# Altium footprint library Connectors.PcbLib: 158 footprints (part 9 of 10)
Each footprint in its own frame and in the unit in brackets; x right, y up, seen from the top. Pads: shape width x height; smd on the part's side, far side on the other; paste and mask are expansions set on the pad; w line width, h text height; cw(c..) or ccw(c..) is an arc to the next point about the centre after c.
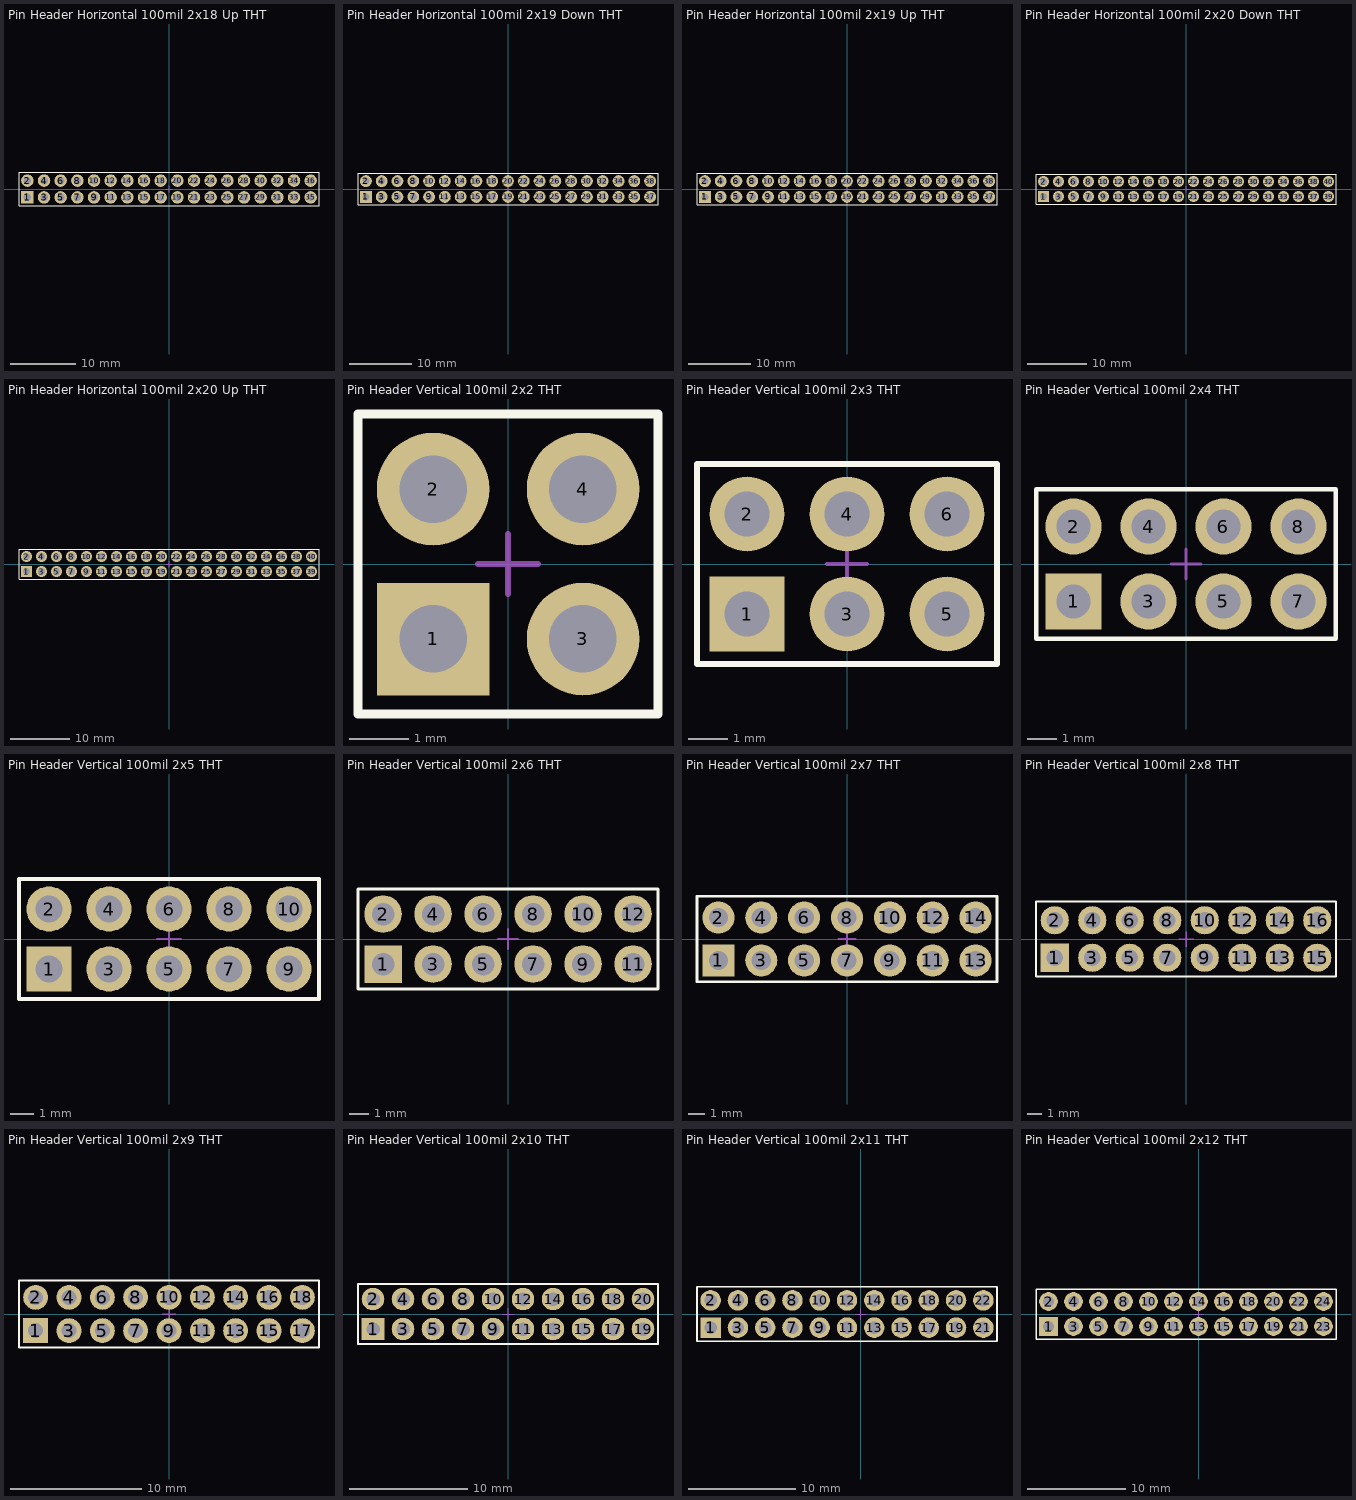
[diagram p8: the footprints below, top view; thin cyan lines are the x and y axes]

## Pin Header Horizontal 100mil 2x18 Up THT [mil]
pads (36):
  rect 75x75 hole 45: 1(-850,-50)
  round 75 hole 45: 2(-850,50) 3(-750,-50) 4(-750,50) 5(-650,-50) 6(-650,50) 7(-550,-50) 8(-550,50) 9(-450,-50) 10(-450,50) 11(-350,-50) 12(-350,50) 13(-250,-50) 14(-250,50) 15(-150,-50) 16(-150,50) 17(-50,-50) 18(-50,50) 19(50,-50) 20(50,50) 21(150,-50) 22(150,50) 23(250,-50) 24(250,50) 25(350,-50) 26(350,50) 27(450,-50) 28(450,50) 29(550,-50) 30(550,50) 31(650,-50) 32(650,50) 33(750,-50) 34(750,50) 35(850,-50) 36(850,50)
Top Overlay:
  lines w6: -900,-100 900,-100 900,100 -900,100 -900,-100
Mechanical 15:
  lines w4: -20,0 20,0 ; 0,-20 0,20
3D body "pin_header_horizontal_100mil_2x18_THT.stp": height 201, standoff -117.11, extent -899.99,-61.65 900.01,446.23

## Pin Header Horizontal 100mil 2x19 Down THT [mil]
pads (38):
  rect 75x75 hole 45: 1(-900,-50)
  round 75 hole 45: 2(-900,50) 3(-800,-50) 4(-800,50) 5(-700,-50) 6(-700,50) 7(-600,-50) 8(-600,50) 9(-500,-50) 10(-500,50) 11(-400,-50) 12(-400,50) 13(-300,-50) 14(-300,50) 15(-200,-50) 16(-200,50) 17(-100,-50) 18(-100,50) 19(0,-50) 20(0,50) 21(100,-50) 22(100,50) 23(200,-50) 24(200,50) 25(300,-50) 26(300,50) 27(400,-50) 28(400,50) 29(500,-50) 30(500,50) 31(600,-50) 32(600,50) 33(700,-50) 34(700,50) 35(800,-50) 36(800,50) 37(900,-50) 38(900,50)
Top Overlay:
  lines w6: -950,-100 -950,100 950,100 950,-100 -950,-100
Mechanical 15:
  lines w4: -20,0 20,0 ; 0,-20 0,20
3D body "pin_header_horizontal_100mil_2x2_THT.stp": height 201, standoff -117.11, extent 750,-443.94 950,63.94
3D body "pin_header_horizontal_100mil_2x17_THT.stp": height 201, standoff -117.11, extent -950,-446.22 750,61.65

## Pin Header Horizontal 100mil 2x19 Up THT [mil]
pads (38):
  rect 75x75 hole 45: 1(-900,-50)
  round 75 hole 45: 2(-900,50) 3(-800,-50) 4(-800,50) 5(-700,-50) 6(-700,50) 7(-600,-50) 8(-600,50) 9(-500,-50) 10(-500,50) 11(-400,-50) 12(-400,50) 13(-300,-50) 14(-300,50) 15(-200,-50) 16(-200,50) 17(-100,-50) 18(-100,50) 19(0,-50) 20(0,50) 21(100,-50) 22(100,50) 23(200,-50) 24(200,50) 25(300,-50) 26(300,50) 27(400,-50) 28(400,50) 29(500,-50) 30(500,50) 31(600,-50) 32(600,50) 33(700,-50) 34(700,50) 35(800,-50) 36(800,50) 37(900,-50) 38(900,50)
Top Overlay:
  lines w6: -950,-100 950,-100 950,100 -950,100 -950,-100
Mechanical 15:
  lines w4: -20,0 20,0 ; 0,-20 0,20
3D body "pin_header_horizontal_100mil_2x17_THT.stp": height 201, standoff -117.11, extent -950,-57.88 750,450
3D body "pin_header_horizontal_100mil_2x2_THT.stp": height 201, standoff -117.11, extent 750,-57.88 950,450

## Pin Header Horizontal 100mil 2x20 Down THT [mil]
pads (40):
  rect 75x75 hole 45: 1(-950,-50)
  round 75 hole 45: 2(-950,50) 3(-850,-50) 4(-850,50) 5(-750,-50) 6(-750,50) 7(-650,-50) 8(-650,50) 9(-550,-50) 10(-550,50) 11(-450,-50) 12(-450,50) 13(-350,-50) 14(-350,50) 15(-250,-50) 16(-250,50) 17(-150,-50) 18(-150,50) 19(-50,-50) 20(-50,50) 21(50,-50) 22(50,50) 23(150,-50) 24(150,50) 25(250,-50) 26(250,50) 27(350,-50) 28(350,50) 29(450,-50) 30(450,50) 31(550,-50) 32(550,50) 33(650,-50) 34(650,50) 35(750,-50) 36(750,50) 37(850,-50) 38(850,50) 39(950,-50) 40(950,50)
Top Overlay:
  lines w6: -1000,-100 -1000,100 1000,100 1000,-100 -1000,-100
Mechanical 15:
  lines w4: -20,0 20,0 ; 0,-20 0,20
3D body "pin_header_horizontal_100mil_2x20_THT.stp": height 201, standoff -117.11, extent -1000,-446.22 1000,61.65

## Pin Header Horizontal 100mil 2x20 Up THT [mil]
pads (40):
  rect 75x75 hole 45: 1(-950,-50)
  round 75 hole 45: 2(-950,50) 3(-850,-50) 4(-850,50) 5(-750,-50) 6(-750,50) 7(-650,-50) 8(-650,50) 9(-550,-50) 10(-550,50) 11(-450,-50) 12(-450,50) 13(-350,-50) 14(-350,50) 15(-250,-50) 16(-250,50) 17(-150,-50) 18(-150,50) 19(-50,-50) 20(-50,50) 21(50,-50) 22(50,50) 23(150,-50) 24(150,50) 25(250,-50) 26(250,50) 27(350,-50) 28(350,50) 29(450,-50) 30(450,50) 31(550,-50) 32(550,50) 33(650,-50) 34(650,50) 35(750,-50) 36(750,50) 37(850,-50) 38(850,50) 39(950,-50) 40(950,50)
Top Overlay:
  lines w6: -1000,-100 1000,-100 1000,100 -1000,100 -1000,-100
Mechanical 15:
  lines w4: -20,0 20,0 ; 0,-20 0,20
3D body "pin_header_horizontal_100mil_2x20_THT.stp": height 201, standoff -117.11, extent -999.99,-61.65 1000.01,446.23

## Pin Header Vertical 100mil 2x2 THT [mil]
pads (4):
  rect 75x75 hole 45: 1(-50,-50)
  round 75 hole 45: 2(-50,50) 3(50,-50) 4(50,50)
Top Overlay:
  lines w6: -100,-100 -100,100 100,100 100,-100 -100,-100
Mechanical 15:
  lines w4: -20,0 20,0 ; 0,-20 0,20
3D body "pin_header_vertical_100mil_2x2_THT.stp": height 337.22, standoff -117.11, extent -99.99,-99.99 100.01,100.01

## Pin Header Vertical 100mil 2x3 THT [mil]
pads (6):
  rect 75x75 hole 45: 1(-100,-50)
  round 75 hole 45: 2(-100,50) 3(0,-50) 4(0,50) 5(100,-50) 6(100,50)
Top Overlay:
  lines w6: -150,-100 150,-100 150,100 -150,100 -150,-100
Mechanical 15:
  lines w4: -20,0 20,0 ; 0,-20 0,20
3D body "pin_header_vertical_100mil_2x3_THT.stp": height 337.22, standoff -117.11, extent -149.99,-99.99 150.01,100.01

## Pin Header Vertical 100mil 2x4 THT [mil]
pads (8):
  rect 75x75 hole 45: 1(-150,-50)
  round 75 hole 45: 2(-150,50) 3(-50,-50) 4(-50,50) 5(50,-50) 6(50,50) 7(150,-50) 8(150,50)
Top Overlay:
  lines w6: -200,-100 200,-100 200,100 -200,100 -200,-100
Mechanical 15:
  lines w4: -20,0 20,0 ; 0,-20 0,20
3D body "pin_header_vertical_100mil_2x4_THT.stp": height 337.22, standoff -117.11, extent -199.99,-99.99 200.01,100.01

## Pin Header Vertical 100mil 2x5 THT [mil]
pads (10):
  rect 75x75 hole 45: 1(-200,-50)
  round 75 hole 45: 2(-200,50) 3(-100,-50) 4(-100,50) 5(0,-50) 6(0,50) 7(100,-50) 8(100,50) 9(200,-50) 10(200,50)
Top Overlay:
  lines w6: -250,-100 -250,100 250,100 250,-100 -250,-100
Mechanical 15:
  lines w4: -20,0 20,0 ; 0,-20 0,20
3D body "pin_header_vertical_100mil_2x5_THT.stp": height 337.22, standoff -117.11, extent -249.99,-99.99 250.01,100.01

## Pin Header Vertical 100mil 2x6 THT [mil]
pads (12):
  rect 75x75 hole 45: 1(-250,-50)
  round 75 hole 45: 2(-250,50) 3(-150,-50) 4(-150,50) 5(-50,-50) 6(-50,50) 7(50,-50) 8(50,50) 9(150,-50) 10(150,50) 11(250,-50) 12(250,50)
Top Overlay:
  lines w6: -300,-100 -300,100 300,100 300,-100 -300,-100
Mechanical 15:
  lines w4: -20,0 20,0 ; 0,-20 0,20
3D body "pin_header_vertical_100mil_2x6_THT.stp": height 337.22, standoff -117.11, extent -299.99,-99.99 300.01,100.01

## Pin Header Vertical 100mil 2x7 THT [mil]
pads (14):
  rect 75x75 hole 45: 1(-300,-50)
  round 75 hole 45: 2(-300,50) 3(-200,-50) 4(-200,50) 5(-100,-50) 6(-100,50) 7(0,-50) 8(0,50) 9(100,-50) 10(100,50) 11(200,-50) 12(200,50) 13(300,-50) 14(300,50)
Top Overlay:
  lines w6: -350,-100 -350,100 350,100 350,-100 -350,-100
Mechanical 15:
  lines w4: -20,0 20,0 ; 0,-20 0,20
3D body "pin_header_vertical_100mil_2x7_THT.stp": height 337.22, standoff -117.11, extent -349.99,-99.99 350.01,100.01

## Pin Header Vertical 100mil 2x8 THT [mil]
pads (16):
  rect 75x75 hole 45: 1(-350,-50)
  round 75 hole 45: 2(-350,50) 3(-250,-50) 4(-250,50) 5(-150,-50) 6(-150,50) 7(-50,-50) 8(-50,50) 9(50,-50) 10(50,50) 11(150,-50) 12(150,50) 13(250,-50) 14(250,50) 15(350,-50) 16(350,50)
Top Overlay:
  lines w6: -400,-100 400,-100 400,100 -400,100 -400,-100
Mechanical 15:
  lines w4: -20,0 20,0 ; 0,-20 0,20
3D body "pin_header_vertical_100mil_2x8_THT.stp": height 337.22, standoff -117.11, extent -400,-100 400,100

## Pin Header Vertical 100mil 2x9 THT [mil]
pads (18):
  rect 75x75 hole 45: 1(-400,-50)
  round 75 hole 45: 2(-400,50) 3(-300,-50) 4(-300,50) 5(-200,-50) 6(-200,50) 7(-100,-50) 8(-100,50) 9(0,-50) 10(0,50) 11(100,-50) 12(100,50) 13(200,-50) 14(200,50) 15(300,-50) 16(300,50) 17(400,-50) 18(400,50)
Top Overlay:
  lines w6: -450,-100 450,-100 450,100 -450,100 -450,-100
Mechanical 15:
  lines w4: -20,0 20,0 ; 0,-20 0,20
3D body "pin_header_vertical_100mil_2x9_THT.stp": height 337.22, standoff -117.11, extent -449.99,-99.99 450.01,100.01

## Pin Header Vertical 100mil 2x10 THT [mil]
pads (20):
  rect 75x75 hole 45: 1(-450,-50)
  round 75 hole 45: 2(-450,50) 3(-350,-50) 4(-350,50) 5(-250,-50) 6(-250,50) 7(-150,-50) 8(-150,50) 9(-50,-50) 10(-50,50) 11(50,-50) 12(50,50) 13(150,-50) 14(150,50) 15(250,-50) 16(250,50) 17(350,-50) 18(350,50) 19(450,-50) 20(450,50)
Top Overlay:
  lines w6: -500,-100 -500,100 500,100 500,-100 -500,-100
Mechanical 15:
  lines w4: -20,0 20,0 ; 0,-20 0,20
3D body "pin_header_vertical_100mil_2x10_THT.stp": height 337.22, standoff -117.11, extent -499.99,-99.99 500.01,100.01

## Pin Header Vertical 100mil 2x11 THT [mil]
pads (22):
  rect 75x75 hole 45: 1(-550,-50)
  round 75 hole 45: 2(-550,50) 3(-450,-50) 4(-450,50) 5(-350,-50) 6(-350,50) 7(-250,-50) 8(-250,50) 9(-150,-50) 10(-150,50) 11(-50,-50) 12(-50,50) 13(50,-50) 14(50,50) 15(150,-50) 16(150,50) 17(250,-50) 18(250,50) 19(350,-50) 20(350,50) 21(450,-50) 22(450,50)
Top Overlay:
  lines w6: -600,-100 500,-100 500,100 -600,100 -600,-100
Mechanical 15:
  lines w4: -20,0 20,0 ; 0,-20 0,20
3D body "pin_header_vertical_100mil_2x11_THT.stp": height 337.22, standoff -117.11, extent -599.99,-99.99 500.01,100.01

## Pin Header Vertical 100mil 2x12 THT [mil]
pads (24):
  rect 75x75 hole 45: 1(-600,-50)
  round 75 hole 45: 2(-600,50) 3(-500,-50) 4(-500,50) 5(-400,-50) 6(-400,50) 7(-300,-50) 8(-300,50) 9(-200,-50) 10(-200,50) 11(-100,-50) 12(-100,50) 13(0,-50) 14(0,50) 15(100,-50) 16(100,50) 17(200,-50) 18(200,50) 19(300,-50) 20(300,50) 21(400,-50) 22(400,50) 23(500,-50) 24(500,50)
Top Overlay:
  lines w6: -650,-100 550,-100 550,100 -650,100 -650,-100
Mechanical 15:
  lines w4: -20,0 20,0 ; 0,-20 0,20
3D body "pin_header_vertical_100mil_2x12_THT.stp": height 337.22, standoff -117.11, extent -649.99,-99.99 550.01,100.01